# Altium footprint library my_lib.PcbLib: 121 footprints (part 4 of 8)
Each footprint in its own frame and in the unit in brackets; x right, y up, seen from the top. Pads: shape width x height; smd on the part's side, far side on the other; paste and mask are expansions set on the pad; w line width, h text height; cw(c..) or ccw(c..) is an arc to the next point about the centre after c.
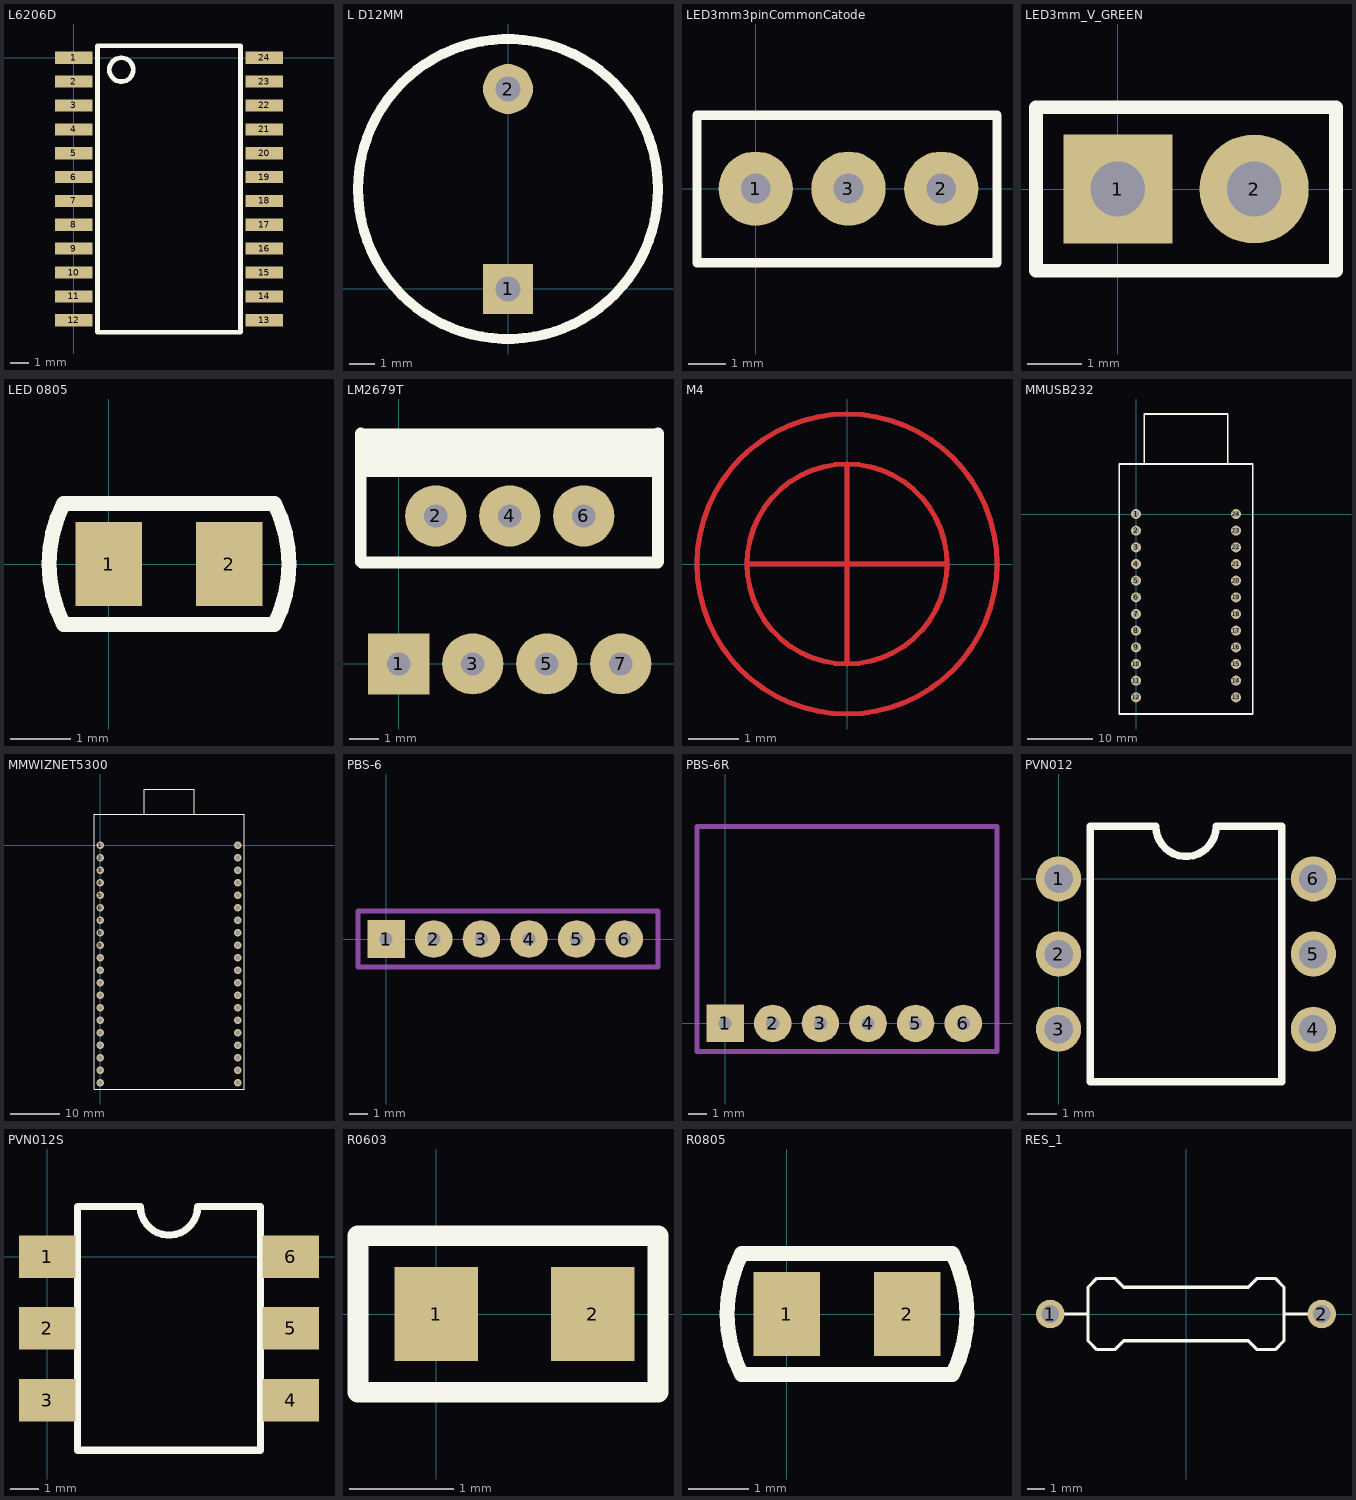
[diagram p3: the footprints below, top view; thin cyan lines are the x and y axes]

## L6206D [mm]
pads (24):
  rect 2x0.65 smd: 1(0,0) 2(0,-1.27) 3(0,-2.54) 4(0,-3.81) 5(0,-5.08) 6(0,-6.35) 7(0,-7.62) 8(0,-8.89) 9(0,-10.16) 10(0,-11.43) 11(0,-12.7) 12(0,-13.97) 13(10.16,-13.97) 14(10.16,-12.7) 15(10.16,-11.43) 16(10.16,-10.16) 17(10.16,-8.89) 18(10.16,-7.62) 19(10.16,-6.35) 20(10.16,-5.08) 21(10.16,-3.81) 22(10.16,-2.54) 23(10.16,-1.27) 24(10.16,0)
Top Overlay:
  lines w0.254: 1.27,-14.605 8.89,-14.605 8.89,0.635 1.27,0.635 1.27,-14.605 ; 1.905,-0.635 cw(c2.54,-0.635) 3.175,-0.635 cw(c2.54,-0.635) 1.905,-0.635

## L D12MM [mm]
pads (2):
  rect 2x2 hole 1: 1(0,0)
  round 2 hole 1: 2(0,8)
Top Overlay:
  lines w0.4: -6,4 ccw(c0,4) 6,4 ccw(c0,4) -6,4

## LED3mm3pinCommonCatode [mm]
pads (3):
  round 2 hole 0.8: 1(0,0) 2(5,0) 3(2.5,0)
Top Overlay:
  lines w0.254: -1.58,-2 -1.58,1.977 6.5,1.977 6.5,-2 -1.58,-2
3D body "everlight-3MM-LED-RG.sldprt": height 8.67, standoff -1, extent -0.25,-1.9 5.23,1.9

## LED3mm_V_GREEN [mm]
pads (2):
  rect 2x2 hole 1: 1(0,0)
  round 2 hole 1: 2(2.5,0)
Top Overlay:
  lines w0.254: -1.5,-1.5 4,-1.5 4,1.5 -1.5,1.5 -1.5,-1.5
3D body "ALSRobot-LED GREEN 3mm V.sldprt": height 4.5, standoff -1.5, extent -0.7,-6.296 2.85,0.452

## LED 0805 [mm]
pads (2):
  rect 1.1x1.4 smd: 1(0,0) 2(2,0)
Top Overlay:
  lines w0.25: -0.75,-1 2.75,-1 ; -0.75,1 2.75,1 ; -0.749,-1.001 cw(c1.25,0) -0.749,1.001 ; 2.749,-1.001 ccw(c0.75,0) 2.749,1.001
3D body "LED-0805-Green.step": height 0.8, standoff -0.01, extent 0.14,-0.625 2.16,0.625

## LM2679T [mm]
pads (7):
  rect 2.1x2.1 hole 0.8: 1(0,0)
  round 2.1 hole 0.8: 2(1.27,5.08) 3(2.54,0) 4(3.81,5.08) 5(5.08,0) 6(6.35,5.08) 7(7.62,0)
Top Overlay:
  region: -1.4,7.91 -1.4,6.61 8.9,6.61 8.9,7.91
  lines w0.4: -1.3,3.51 -1.3,7.91 ; -1.3,6.61 8.8,6.61 ; -1.27,3.48 8.89,3.48 ; -1.27,7.89 8.89,7.89 ; 8.9,3.51 8.9,5.21 ; 8.9,5.11 8.9,7.91

## M4 [mm]
Top Layer:
  lines w0.1: 0,-2 0,2 ; 1.9,0 -2,0 ; -2,0 ccw(c0,0) 2,0 ; -2,0 cw(c0,0) 2,0 ; -2,0 2,0 ; -3,0 ccw(c0,0) 3,0 ccw(c0,0) -3,0
Bottom Layer:
  lines w0.1: 0,-2 0,2 ; -2,0 ccw(c0,0) 2,0 ; -2,0 cw(c0,0) 2,0 ; -2,0 2,0 ; -3,0 ccw(c0,0) 3,0 ccw(c0,0) -3,0

## MMUSB232 [mil]
pads (24):
  round 60 hole 38: 1(0,0) 2(0,-100) 3(0,-200) 4(0,-300) 5(0,-400) 6(0,-500) 7(0,-600) 8(0,-700) 9(0,-800) 10(0,-900) 11(0,-1000) 12(0,-1100) 13(600,-1100) 14(600,-1000) 15(600,-900) 16(600,-800) 17(600,-700) 18(600,-600) 19(600,-500) 20(600,-400) 21(600,-300) 22(600,-200) 23(600,-100) 24(600,0)
Top Overlay:
  lines w10: 50,300 50,600 550,600 550,300 ; -100,-1200 -100,300 700,300 700,-1200 -100,-1200

## MMWIZNET5300 [mil]
pads (40):
  round 60 hole 38: 1(0,0) 2(0,-100) 3(0,-200) 4(0,-300) 5(0,-400) 6(0,-500) 7(0,-600) 8(0,-700) 9(0,-800) 10(0,-900) 11(0,-1000) 12(0,-1100) 13(0,-1200) 14(0,-1300) 15(0,-1400) 16(0,-1500) 17(0,-1600) 18(0,-1700) 19(0,-1800) 20(0,-1900) 21(1100,-1900) 22(1100,-1800) 23(1100,-1700) 24(1100,-1600) 25(1100,-1500) 26(1100,-1400) 27(1100,-1300) 28(1100,-1200) 29(1100,-1100) 30(1100,-1000) 31(1100,-900) 32(1100,-800) 33(1100,-700) 34(1100,-600) 35(1100,-500) 36(1100,-400) 37(1100,-300) 38(1100,-200) 39(1100,-100) 40(1100,0)
Top Overlay:
  lines w10: 350,250 350,450 750,450 750,250 ; -50,-1950 1150,-1950 1150,250 -50,250 -50,-1950

## PBS-6 [mm]
pads (6):
  rect 2x2 hole 0.7: 1(0,0)
  round 2 hole 0.7: 2(2.54,0) 3(5.08,0) 4(7.62,0) 5(10.16,0) 6(12.7,0)
Mechanical 15:
  lines w0.254: -1.5,-1.5 14.5,-1.5 14.5,1.5 -1.5,1.5 -1.5,-1.5
3D body "PBS-6.step": height 8.5, standoff -3, extent -1.27,-1.27 13.97,1.27

## PBS-6R [mm]
pads (6):
  rect 2x2 hole 0.7: 1(0,0)
  round 2 hole 0.7: 2(2.54,0) 3(5.08,0) 4(7.62,0) 5(10.16,0) 6(12.7,0)
Mechanical 15:
  lines w0.254: -1.5,-1.5 14.5,-1.5 14.5,10.5 -1.5,10.5 -1.5,-1.5
3D body "PBS-6R.step": height 3.3, standoff -2.54, extent -1.265,-0.235 13.975,9.965

## PVN012 [mil]
pads (6):
  round 60 hole 38: 1(0,0) 2(0,-100) 3(0,-200) 4(339.37,-200) 5(339.37,-100) 6(339.37,0)
Top Overlay:
  lines w10: 42.32,-269.88 42.32,69.88 129.69,69.88 ccw(c169.69,69.88) 209.69,69.88 297.05,69.88 297.05,-269.88 42.32,-269.88

## PVN012S [mm]
pads (6):
  rect 2x1.5 smd: 1(0,0) 2(0,-2.54) 3(0,-5.08) 4(8.62,-5.08) 5(8.62,-2.54) 6(8.62,0)
Top Overlay:
  lines w0.254: 1.075,-6.855 7.545,-6.855 7.545,1.775 5.326,1.775 cw(c4.31,1.775) 3.294,1.775 1.075,1.775 1.075,-6.855

## R0603 [mm]
pads (2):
  rect 0.8x0.9 smd: 1(0,0) 2(1.5,0)
Top Overlay:
  lines w0.2: -0.75,-0.75 -0.75,0.75 2.125,0.75 2.125,-0.75 -0.75,-0.75

## R0805 [mm]
pads (2):
  rect 1.1x1.4 smd: 1(0,0) 2(2,0)
Top Overlay:
  lines w0.25: -0.75,-1 2.75,-1 ; -0.75,1 2.75,1 ; -0.749,-1.001 cw(c1.25,0) -0.749,1.001 ; 2.749,-1.001 ccw(c0.75,0) 2.749,1.001

## RES_1 [mm]
pads (2):
  round 1.6 hole 1: 1(-7.62,0) 2(7.62,0)
Top Overlay:
  lines w0.178: -7.62,0 -5.5,0 ; 5.5,0 7.62,0 ; -5.5,-1.5 -5.5,1.5 -5,2 -4,2 -3.5,1.5 0,1.5 3.5,1.5 4,2 5,2 5.5,1.5 5.5,-1.5 5,-2 4,-2 3.5,-1.5 0,-1.5 -3.5,-1.5 -4,-2 -5,-2 -5.5,-1.5